# Altium schematic symbol library jlcpcb_2025_04_capacitors_extended_1206.schlib: 2503 symbols (part 6 of 14) (continued)
## CC1206JRNPO0BN100
designator C?  Capacitance: 10pF  (hidden comment: *)
Capacitor, Ceramic (MLCC), 10pF, ±5%, 100V, NP0, ±5%, SMD 1206; Manufacturer: YAGEO; Manufacturer Part Number: CC1206JRNPO0BN100; Package Size: 1206; JLCPCB Basic Part: No; JLCPCB Part Number: C577147; Supplier 1: LCSC; Category: Capacitors - MLCC; Supplier Part Number 1: C577147; Tolerance: ±5%; Voltage Rating: 100V; Temperature Coefficient: NP0; RoHS: Yes; ComponentLink1Description: Datasheet; ComponentLink1URL: https://wmsc.lcsc.com/wmsc/upload/file/pdf/v2/lcsc/2304140030_YAGEO-CC1206JRNPO0BN100_C577147.pdf; ComponentLink2Description: JLCPCB Part URL; ComponentLink2URL: https://jlcpcb.com/partdetail/C577147; ComponentLink3Description: LCSC Part URL; ComponentLink3URL: https://lcsc.com/product-detail/Multilayer-Ceramic-Capacitors-MLCC---SMD-SMT_YAGEO-YAGEO-CC1206JRNPO0BN100_C577147.html
footprint CAP-1206 (1206 (3216M) Capacitor)
pins: 1, 2

## CC1206JRNPO0BN101
designator C?  Capacitance: 100pF  (hidden comment: *)
Capacitor, Ceramic (MLCC), 100pF, ±5%, 100V, NP0, ±5%, SMD 1206; Manufacturer: YAGEO; Manufacturer Part Number: CC1206JRNPO0BN101; Package Size: 1206; JLCPCB Basic Part: No; JLCPCB Part Number: C309499; Supplier 1: LCSC; Category: Capacitors - MLCC; Supplier Part Number 1: C309499; Tolerance: ±5%; Voltage Rating: 100V; Temperature Coefficient: NP0; RoHS: Yes; ComponentLink1Description: Datasheet; ComponentLink1URL: https://wmsc.lcsc.com/wmsc/upload/file/pdf/v2/lcsc/1810241116_YAGEO-CC1206JRNPO0BN101_C309499.pdf; ComponentLink2Description: JLCPCB Part URL; ComponentLink2URL: https://jlcpcb.com/partdetail/C309499; ComponentLink3Description: LCSC Part URL; ComponentLink3URL: https://lcsc.com/product-detail/Multilayer-Ceramic-Capacitors-MLCC---SMD-SMT_YAGEO-YAGEO-CC1206JRNPO0BN101_C309499.html
footprint CAP-1206 (1206 (3216M) Capacitor)
pins: 1, 2

## CC1206JRNPO0BN102
designator C?  Capacitance: 1nF  (hidden comment: *)
Capacitor, Ceramic (MLCC), 1nF, ±5%, 100V, NP0, ±5%, SMD 1206; Manufacturer: YAGEO; Manufacturer Part Number: CC1206JRNPO0BN102; Package Size: 1206; JLCPCB Basic Part: No; JLCPCB Part Number: C513661; Supplier 1: LCSC; Category: Capacitors - MLCC; Supplier Part Number 1: C513661; Tolerance: ±5%; Voltage Rating: 100V; Temperature Coefficient: NP0; RoHS: Yes; ComponentLink1Description: Datasheet; ComponentLink1URL: https://wmsc.lcsc.com/wmsc/upload/file/pdf/v2/lcsc/2005142208_YAGEO-CC1206JRNPO0BN102_C513661.pdf; ComponentLink2Description: JLCPCB Part URL; ComponentLink2URL: https://jlcpcb.com/partdetail/C513661; ComponentLink3Description: LCSC Part URL; ComponentLink3URL: https://lcsc.com/product-detail/Multilayer-Ceramic-Capacitors-MLCC---SMD-SMT_YAGEO-YAGEO-CC1206JRNPO0BN102_C513661.html
footprint CAP-1206 (1206 (3216M) Capacitor)
pins: 1, 2

## CC1206JRNPO0BN121
designator C?  Capacitance: 120pF  (hidden comment: *)
Capacitor, Ceramic (MLCC), 120pF, ±5%, 100V, NP0, ±5%, SMD 1206; Manufacturer: YAGEO; Manufacturer Part Number: CC1206JRNPO0BN121; Package Size: 1206; JLCPCB Basic Part: No; JLCPCB Part Number: C527277; Supplier 1: LCSC; Category: Capacitors - MLCC; Supplier Part Number 1: C527277; Tolerance: ±5%; Voltage Rating: 100V; Temperature Coefficient: NP0; RoHS: Yes; ComponentLink1Description: Datasheet; ComponentLink1URL: https://wmsc.lcsc.com/wmsc/upload/file/pdf/v2/lcsc/2005261833_YAGEO-CC1206JRNPO0BN121_C527277.pdf; ComponentLink2Description: JLCPCB Part URL; ComponentLink2URL: https://jlcpcb.com/partdetail/C527277; ComponentLink3Description: LCSC Part URL; ComponentLink3URL: https://lcsc.com/product-detail/Multilayer-Ceramic-Capacitors-MLCC---SMD-SMT_YAGEO-YAGEO-CC1206JRNPO0BN121_C527277.html
footprint CAP-1206 (1206 (3216M) Capacitor)
pins: 1, 2

## CC1206JRNPO0BN122
designator C?  Capacitance: 1.2nF  (hidden comment: *)
Capacitor, Ceramic (MLCC), 1.2nF, ±5%, 100V, NP0, ±5%, SMD 1206; Manufacturer: YAGEO; Manufacturer Part Number: CC1206JRNPO0BN122; Package Size: 1206; JLCPCB Basic Part: No; JLCPCB Part Number: C527278; Supplier 1: LCSC; Category: Capacitors - MLCC; Supplier Part Number 1: C527278; Tolerance: ±5%; Voltage Rating: 100V; Temperature Coefficient: NP0; RoHS: Yes; ComponentLink1Description: Datasheet; ComponentLink1URL: https://wmsc.lcsc.com/wmsc/upload/file/pdf/v2/lcsc/2006181535_YAGEO-CC1206JRNPO0BN122_C527278.pdf; ComponentLink2Description: JLCPCB Part URL; ComponentLink2URL: https://jlcpcb.com/partdetail/C527278; ComponentLink3Description: LCSC Part URL; ComponentLink3URL: https://lcsc.com/product-detail/Multilayer-Ceramic-Capacitors-MLCC---SMD-SMT_YAGEO-YAGEO-CC1206JRNPO0BN122_C527278.html
footprint CAP-1206 (1206 (3216M) Capacitor)
pins: 1, 2

## CC1206JRNPO0BN151
designator C?  Capacitance: 150pF  (hidden comment: *)
Capacitor, Ceramic (MLCC), 150pF, ±5%, 100V, NP0, ±5%, SMD 1206; Manufacturer: YAGEO; Manufacturer Part Number: CC1206JRNPO0BN151; Package Size: 1206; JLCPCB Basic Part: No; JLCPCB Part Number: C577150; Supplier 1: LCSC; Category: Capacitors - MLCC; Supplier Part Number 1: C577150; Tolerance: ±5%; Voltage Rating: 100V; Temperature Coefficient: NP0; RoHS: Yes; ComponentLink1Description: Datasheet; ComponentLink1URL: https://wmsc.lcsc.com/wmsc/upload/file/pdf/v2/lcsc/2204021130_YAGEO-CC1206JRNPO0BN151_C577150.pdf; ComponentLink2Description: JLCPCB Part URL; ComponentLink2URL: https://jlcpcb.com/partdetail/C577150; ComponentLink3Description: LCSC Part URL; ComponentLink3URL: https://lcsc.com/product-detail/Multilayer-Ceramic-Capacitors-MLCC---SMD-SMT_YAGEO-YAGEO-CC1206JRNPO0BN151_C577150.html
footprint CAP-1206 (1206 (3216M) Capacitor)
pins: 1, 2

## CC1206JRNPO0BN152
designator C?  Capacitance: 1.5nF  (hidden comment: *)
Capacitor, Ceramic (MLCC), 1.5nF, ±5%, 100V, NP0, ±5%, SMD 1206; Manufacturer: YAGEO; Manufacturer Part Number: CC1206JRNPO0BN152; Package Size: 1206; JLCPCB Basic Part: No; JLCPCB Part Number: C309500; Supplier 1: LCSC; Category: Capacitors - MLCC; Supplier Part Number 1: C309500; Tolerance: ±5%; Voltage Rating: 100V; Temperature Coefficient: NP0; RoHS: Yes; ComponentLink1Description: Datasheet; ComponentLink1URL: https://wmsc.lcsc.com/wmsc/upload/file/pdf/v2/lcsc/2304140030_YAGEO-CC1206JRNPO0BN152_C309500.pdf; ComponentLink2Description: JLCPCB Part URL; ComponentLink2URL: https://jlcpcb.com/partdetail/C309500; ComponentLink3Description: LCSC Part URL; ComponentLink3URL: https://lcsc.com/product-detail/Multilayer-Ceramic-Capacitors-MLCC---SMD-SMT_YAGEO-YAGEO-CC1206JRNPO0BN152_C309500.html
footprint CAP-1206 (1206 (3216M) Capacitor)
pins: 1, 2

## CC1206JRNPO0BN180
designator C?  Capacitance: 18pF  (hidden comment: *)
Capacitor, Ceramic (MLCC), 18pF, ±5%, 100V, NP0, ±5%, SMD 1206; Manufacturer: YAGEO; Manufacturer Part Number: CC1206JRNPO0BN180; Package Size: 1206; JLCPCB Basic Part: No; JLCPCB Part Number: C527279; Supplier 1: LCSC; Category: Capacitors - MLCC; Supplier Part Number 1: C527279; Tolerance: ±5%; Voltage Rating: 100V; Temperature Coefficient: NP0; RoHS: Yes; ComponentLink1Description: Datasheet; ComponentLink1URL: https://wmsc.lcsc.com/wmsc/upload/file/pdf/v2/lcsc/2006031836_YAGEO-CC1206JRNPO0BN180_C527279.pdf; ComponentLink2Description: JLCPCB Part URL; ComponentLink2URL: https://jlcpcb.com/partdetail/C527279; ComponentLink3Description: LCSC Part URL; ComponentLink3URL: https://lcsc.com/product-detail/Multilayer-Ceramic-Capacitors-MLCC---SMD-SMT_YAGEO-YAGEO-CC1206JRNPO0BN180_C527279.html
footprint CAP-1206 (1206 (3216M) Capacitor)
pins: 1, 2

## CC1206JRNPO0BN181
designator C?  Capacitance: 180pF  (hidden comment: *)
Capacitor, Ceramic (MLCC), 180pF, ±5%, 100V, NP0, ±5%, SMD 1206; Manufacturer: YAGEO; Manufacturer Part Number: CC1206JRNPO0BN181; Package Size: 1206; JLCPCB Basic Part: No; JLCPCB Part Number: C527280; Supplier 1: LCSC; Category: Capacitors - MLCC; Supplier Part Number 1: C527280; Tolerance: ±5%; Voltage Rating: 100V; Temperature Coefficient: NP0; RoHS: Yes; ComponentLink1Description: Datasheet; ComponentLink1URL: https://wmsc.lcsc.com/wmsc/upload/file/pdf/v2/lcsc/2007021837_YAGEO-CC1206JRNPO0BN181_C527280.pdf; ComponentLink2Description: JLCPCB Part URL; ComponentLink2URL: https://jlcpcb.com/partdetail/C527280; ComponentLink3Description: LCSC Part URL; ComponentLink3URL: https://lcsc.com/product-detail/Multilayer-Ceramic-Capacitors-MLCC---SMD-SMT_YAGEO-YAGEO-CC1206JRNPO0BN181_C527280.html
footprint CAP-1206 (1206 (3216M) Capacitor)
pins: 1, 2

## CC1206JRNPO0BN182
designator C?  Capacitance: 1.8nF  (hidden comment: *)
Capacitor, Ceramic (MLCC), 1.8nF, ±5%, 100V, NP0, ±5%, SMD 1206; Manufacturer: YAGEO; Manufacturer Part Number: CC1206JRNPO0BN182; Package Size: 1206; JLCPCB Basic Part: No; JLCPCB Part Number: C527281; Supplier 1: LCSC; Category: Capacitors - MLCC; Supplier Part Number 1: C527281; Tolerance: ±5%; Voltage Rating: 100V; Temperature Coefficient: NP0; RoHS: Yes; ComponentLink1Description: Datasheet; ComponentLink1URL: https://wmsc.lcsc.com/wmsc/upload/file/pdf/v2/lcsc/2005222142_YAGEO-CC1206JRNPO0BN182_C527281.pdf; ComponentLink2Description: JLCPCB Part URL; ComponentLink2URL: https://jlcpcb.com/partdetail/C527281; ComponentLink3Description: LCSC Part URL; ComponentLink3URL: https://lcsc.com/product-detail/Multilayer-Ceramic-Capacitors-MLCC---SMD-SMT_YAGEO-YAGEO-CC1206JRNPO0BN182_C527281.html
footprint CAP-1206 (1206 (3216M) Capacitor)
pins: 1, 2

## CC1206JRNPO0BN220
designator C?  Capacitance: 22pF  (hidden comment: *)
Capacitor, Ceramic (MLCC), 22pF, ±5%, 100V, NP0, ±5%, SMD 1206; Manufacturer: YAGEO; Manufacturer Part Number: CC1206JRNPO0BN220; Package Size: 1206; JLCPCB Basic Part: No; JLCPCB Part Number: C113878; Supplier 1: LCSC; Category: Capacitors - MLCC; Supplier Part Number 1: C113878; Tolerance: ±5%; Voltage Rating: 100V; Temperature Coefficient: NP0; RoHS: Yes; ComponentLink1Description: Datasheet; ComponentLink1URL: https://wmsc.lcsc.com/wmsc/upload/file/pdf/v2/lcsc/2304140030_YAGEO-CC1206JRNPO0BN220_C113878.pdf; ComponentLink2Description: JLCPCB Part URL; ComponentLink2URL: https://jlcpcb.com/partdetail/C113878; ComponentLink3Description: LCSC Part URL; ComponentLink3URL: https://lcsc.com/product-detail/Multilayer-Ceramic-Capacitors-MLCC---SMD-SMT_YAGEO-YAGEO-CC1206JRNPO0BN220_C113878.html
footprint CAP-1206 (1206 (3216M) Capacitor)
pins: 1, 2

## CC1206JRNPO0BN221
designator C?  Capacitance: 220pF  (hidden comment: *)
Capacitor, Ceramic (MLCC), 220pF, ±5%, 100V, NP0, ±5%, SMD 1206; Manufacturer: YAGEO; Manufacturer Part Number: CC1206JRNPO0BN221; Package Size: 1206; JLCPCB Basic Part: No; JLCPCB Part Number: C113879; Supplier 1: LCSC; Category: Capacitors - MLCC; Supplier Part Number 1: C113879; Tolerance: ±5%; Voltage Rating: 100V; Temperature Coefficient: NP0; RoHS: Yes; ComponentLink1Description: Datasheet; ComponentLink1URL: https://wmsc.lcsc.com/wmsc/upload/file/pdf/v2/lcsc/2304140030_YAGEO-CC1206JRNPO0BN221_C113879.pdf; ComponentLink2Description: JLCPCB Part URL; ComponentLink2URL: https://jlcpcb.com/partdetail/C113879; ComponentLink3Description: LCSC Part URL; ComponentLink3URL: https://lcsc.com/product-detail/Multilayer-Ceramic-Capacitors-MLCC---SMD-SMT_YAGEO-YAGEO-CC1206JRNPO0BN221_C113879.html
footprint CAP-1206 (1206 (3216M) Capacitor)
pins: 1, 2

## CC1206JRNPO0BN222
designator C?  Capacitance: 2.2nF  (hidden comment: *)
Capacitor, Ceramic (MLCC), 2.2nF, ±5%, 100V, NP0, ±5%, SMD 1206; Manufacturer: YAGEO; Manufacturer Part Number: CC1206JRNPO0BN222; Package Size: 1206; JLCPCB Basic Part: No; JLCPCB Part Number: C577152; Supplier 1: LCSC; Category: Capacitors - MLCC; Supplier Part Number 1: C577152; Tolerance: ±5%; Voltage Rating: 100V; Temperature Coefficient: NP0; RoHS: Yes; ComponentLink1Description: Datasheet; ComponentLink1URL: https://wmsc.lcsc.com/wmsc/upload/file/pdf/v2/lcsc/2009261808_YAGEO-CC1206JRNPO0BN222_C577152.pdf; ComponentLink2Description: JLCPCB Part URL; ComponentLink2URL: https://jlcpcb.com/partdetail/C577152; ComponentLink3Description: LCSC Part URL; ComponentLink3URL: https://lcsc.com/product-detail/Multilayer-Ceramic-Capacitors-MLCC---SMD-SMT_YAGEO-YAGEO-CC1206JRNPO0BN222_C577152.html
footprint CAP-1206 (1206 (3216M) Capacitor)
pins: 1, 2

## CC1206JRNPO0BN272
designator C?  Capacitance: 2.7nF  (hidden comment: *)
Capacitor, Ceramic (MLCC), 2.7nF, ±5%, 100V, NP0, ±5%, SMD 1206; Manufacturer: YAGEO; Manufacturer Part Number: CC1206JRNPO0BN272; Package Size: 1206; JLCPCB Basic Part: No; JLCPCB Part Number: C527283; Supplier 1: LCSC; Category: Capacitors - MLCC; Supplier Part Number 1: C527283; Tolerance: ±5%; Voltage Rating: 100V; Temperature Coefficient: NP0; RoHS: Yes; ComponentLink1Description: Datasheet; ComponentLink1URL: https://wmsc.lcsc.com/wmsc/upload/file/pdf/v2/lcsc/2005222142_YAGEO-CC1206JRNPO0BN272_C527283.pdf; ComponentLink2Description: JLCPCB Part URL; ComponentLink2URL: https://jlcpcb.com/partdetail/C527283; ComponentLink3Description: LCSC Part URL; ComponentLink3URL: https://lcsc.com/product-detail/Multilayer-Ceramic-Capacitors-MLCC---SMD-SMT_YAGEO-YAGEO-CC1206JRNPO0BN272_C527283.html
footprint CAP-1206 (1206 (3216M) Capacitor)
pins: 1, 2

## CC1206JRNPO0BN330
designator C?  Capacitance: 33pF  (hidden comment: *)
Capacitor, Ceramic (MLCC), 33pF, ±5%, 100V, NP0, ±5%, SMD 1206; Manufacturer: YAGEO; Manufacturer Part Number: CC1206JRNPO0BN330; Package Size: 1206; JLCPCB Basic Part: No; JLCPCB Part Number: C527284; Supplier 1: LCSC; Category: Capacitors - MLCC; Supplier Part Number 1: C527284; Tolerance: ±5%; Voltage Rating: 100V; Temperature Coefficient: NP0; RoHS: Yes; ComponentLink1Description: Datasheet; ComponentLink1URL: https://wmsc.lcsc.com/wmsc/upload/file/pdf/v2/lcsc/2005222142_YAGEO-CC1206JRNPO0BN330_C527284.pdf; ComponentLink2Description: JLCPCB Part URL; ComponentLink2URL: https://jlcpcb.com/partdetail/C527284; ComponentLink3Description: LCSC Part URL; ComponentLink3URL: https://lcsc.com/product-detail/Multilayer-Ceramic-Capacitors-MLCC---SMD-SMT_YAGEO-YAGEO-CC1206JRNPO0BN330_C527284.html
footprint CAP-1206 (1206 (3216M) Capacitor)
pins: 1, 2

## CC1206JRNPO0BN331
designator C?  Capacitance: 330pF  (hidden comment: *)
Capacitor, Ceramic (MLCC), 330pF, ±5%, 100V, NP0, ±5%, SMD 1206; Manufacturer: YAGEO; Manufacturer Part Number: CC1206JRNPO0BN331; Package Size: 1206; JLCPCB Basic Part: No; JLCPCB Part Number: C527285; Supplier 1: LCSC; Category: Capacitors - MLCC; Supplier Part Number 1: C527285; Tolerance: ±5%; Voltage Rating: 100V; Temperature Coefficient: NP0; RoHS: Yes; ComponentLink1Description: Datasheet; ComponentLink1URL: https://wmsc.lcsc.com/wmsc/upload/file/pdf/v2/lcsc/2006031836_YAGEO-CC1206JRNPO0BN331_C527285.pdf; ComponentLink2Description: JLCPCB Part URL; ComponentLink2URL: https://jlcpcb.com/partdetail/C527285; ComponentLink3Description: LCSC Part URL; ComponentLink3URL: https://lcsc.com/product-detail/Multilayer-Ceramic-Capacitors-MLCC---SMD-SMT_YAGEO-YAGEO-CC1206JRNPO0BN331_C527285.html
footprint CAP-1206 (1206 (3216M) Capacitor)
pins: 1, 2

## CC1206JRNPO0BN332
designator C?  Capacitance: 3.3nF  (hidden comment: *)
Capacitor, Ceramic (MLCC), 3.3nF, ±5%, 100V, NP0, ±5%, SMD 1206; Manufacturer: YAGEO; Manufacturer Part Number: CC1206JRNPO0BN332; Package Size: 1206; JLCPCB Basic Part: No; JLCPCB Part Number: C527286; Supplier 1: LCSC; Category: Capacitors - MLCC; Supplier Part Number 1: C527286; Tolerance: ±5%; Voltage Rating: 100V; Temperature Coefficient: NP0; RoHS: Yes; ComponentLink1Description: Datasheet; ComponentLink1URL: https://wmsc.lcsc.com/wmsc/upload/file/pdf/v2/lcsc/2005222142_YAGEO-CC1206JRNPO0BN332_C527286.pdf; ComponentLink2Description: JLCPCB Part URL; ComponentLink2URL: https://jlcpcb.com/partdetail/C527286; ComponentLink3Description: LCSC Part URL; ComponentLink3URL: https://lcsc.com/product-detail/Multilayer-Ceramic-Capacitors-MLCC---SMD-SMT_YAGEO-YAGEO-CC1206JRNPO0BN332_C527286.html
footprint CAP-1206 (1206 (3216M) Capacitor)
pins: 1, 2

## CC1206JRNPO0BN390
designator C?  Capacitance: 39pF  (hidden comment: *)
Capacitor, Ceramic (MLCC), 39pF, ±5%, 100V, NP0, ±5%, SMD 1206; Manufacturer: YAGEO; Manufacturer Part Number: CC1206JRNPO0BN390; Package Size: 1206; JLCPCB Basic Part: No; JLCPCB Part Number: C527287; Supplier 1: LCSC; Category: Capacitors - MLCC; Supplier Part Number 1: C527287; Tolerance: ±5%; Voltage Rating: 100V; Temperature Coefficient: NP0; RoHS: Yes; ComponentLink1Description: Datasheet; ComponentLink1URL: https://wmsc.lcsc.com/wmsc/upload/file/pdf/v2/lcsc/2006031836_YAGEO-CC1206JRNPO0BN390_C527287.pdf; ComponentLink2Description: JLCPCB Part URL; ComponentLink2URL: https://jlcpcb.com/partdetail/C527287; ComponentLink3Description: LCSC Part URL; ComponentLink3URL: https://lcsc.com/product-detail/Multilayer-Ceramic-Capacitors-MLCC---SMD-SMT_YAGEO-YAGEO-CC1206JRNPO0BN390_C527287.html
footprint CAP-1206 (1206 (3216M) Capacitor)
pins: 1, 2

## CC1206JRNPO0BN391
designator C?  Capacitance: 390pF  (hidden comment: *)
Capacitor, Ceramic (MLCC), 390pF, ±5%, 100V, NP0, ±5%, SMD 1206; Manufacturer: YAGEO; Manufacturer Part Number: CC1206JRNPO0BN391; Package Size: 1206; JLCPCB Basic Part: No; JLCPCB Part Number: C527288; Supplier 1: LCSC; Category: Capacitors - MLCC; Supplier Part Number 1: C527288; Tolerance: ±5%; Voltage Rating: 100V; Temperature Coefficient: NP0; RoHS: Yes; ComponentLink1Description: Datasheet; ComponentLink1URL: https://wmsc.lcsc.com/wmsc/upload/file/pdf/v2/lcsc/2006031836_YAGEO-CC1206JRNPO0BN391_C527288.pdf; ComponentLink2Description: JLCPCB Part URL; ComponentLink2URL: https://jlcpcb.com/partdetail/C527288; ComponentLink3Description: LCSC Part URL; ComponentLink3URL: https://lcsc.com/product-detail/Multilayer-Ceramic-Capacitors-MLCC---SMD-SMT_YAGEO-YAGEO-CC1206JRNPO0BN391_C527288.html
footprint CAP-1206 (1206 (3216M) Capacitor)
pins: 1, 2

## CC1206JRNPO0BN470
designator C?  Capacitance: 47pF  (hidden comment: *)
Capacitor, Ceramic (MLCC), 47pF, ±5%, 100V, NP0, ±5%, SMD 1206; Manufacturer: YAGEO; Manufacturer Part Number: CC1206JRNPO0BN470; Package Size: 1206; JLCPCB Basic Part: No; JLCPCB Part Number: C577155; Supplier 1: LCSC; Category: Capacitors - MLCC; Supplier Part Number 1: C577155; Tolerance: ±5%; Voltage Rating: 100V; Temperature Coefficient: NP0; RoHS: Yes; ComponentLink1Description: Datasheet; ComponentLink1URL: https://wmsc.lcsc.com/wmsc/upload/file/pdf/v2/lcsc/2204021130_YAGEO-CC1206JRNPO0BN470_C577155.pdf; ComponentLink2Description: JLCPCB Part URL; ComponentLink2URL: https://jlcpcb.com/partdetail/C577155; ComponentLink3Description: LCSC Part URL; ComponentLink3URL: https://lcsc.com/product-detail/Multilayer-Ceramic-Capacitors-MLCC---SMD-SMT_YAGEO-YAGEO-CC1206JRNPO0BN470_C577155.html
footprint CAP-1206 (1206 (3216M) Capacitor)
pins: 1, 2

## CC1206JRNPO0BN471
designator C?  Capacitance: 470pF  (hidden comment: *)
Capacitor, Ceramic (MLCC), 470pF, ±5%, 100V, NP0, ±5%, SMD 1206; Manufacturer: YAGEO; Manufacturer Part Number: CC1206JRNPO0BN471; Package Size: 1206; JLCPCB Basic Part: No; JLCPCB Part Number: C113880; Supplier 1: LCSC; Category: Capacitors - MLCC; Supplier Part Number 1: C113880; Tolerance: ±5%; Voltage Rating: 100V; Temperature Coefficient: NP0; RoHS: Yes; ComponentLink1Description: Datasheet; ComponentLink1URL: https://wmsc.lcsc.com/wmsc/upload/file/pdf/v2/lcsc/2304140030_YAGEO-CC1206JRNPO0BN471_C113880.pdf; ComponentLink2Description: JLCPCB Part URL; ComponentLink2URL: https://jlcpcb.com/partdetail/C113880; ComponentLink3Description: LCSC Part URL; ComponentLink3URL: https://lcsc.com/product-detail/Multilayer-Ceramic-Capacitors-MLCC---SMD-SMT_YAGEO-YAGEO-CC1206JRNPO0BN471_C113880.html
footprint CAP-1206 (1206 (3216M) Capacitor)
pins: 1, 2

## CC1206JRNPO0BN472
designator C?  Capacitance: 4.7nF  (hidden comment: *)
Capacitor, Ceramic (MLCC), 4.7nF, ±5%, 100V, NP0, ±5%, SMD 1206; Manufacturer: YAGEO; Manufacturer Part Number: CC1206JRNPO0BN472; Package Size: 1206; JLCPCB Basic Part: No; JLCPCB Part Number: C577156; Supplier 1: LCSC; Category: Capacitors - MLCC; Supplier Part Number 1: C577156; Tolerance: ±5%; Voltage Rating: 100V; Temperature Coefficient: NP0; RoHS: Yes; ComponentLink1Description: Datasheet; ComponentLink1URL: https://wmsc.lcsc.com/wmsc/upload/file/pdf/v2/lcsc/2203221230_YAGEO-CC1206JRNPO0BN472_C577156.pdf; ComponentLink2Description: JLCPCB Part URL; ComponentLink2URL: https://jlcpcb.com/partdetail/C577156; ComponentLink3Description: LCSC Part URL; ComponentLink3URL: https://lcsc.com/product-detail/Multilayer-Ceramic-Capacitors-MLCC---SMD-SMT_YAGEO-YAGEO-CC1206JRNPO0BN472_C577156.html
footprint CAP-1206 (1206 (3216M) Capacitor)
pins: 1, 2

## CC1206JRNPO0BN560
designator C?  Capacitance: 56pF  (hidden comment: *)
Capacitor, Ceramic (MLCC), 56pF, ±5%, 100V, NP0, ±5%, SMD 1206; Manufacturer: YAGEO; Manufacturer Part Number: CC1206JRNPO0BN560; Package Size: 1206; JLCPCB Basic Part: No; JLCPCB Part Number: C527289; Supplier 1: LCSC; Category: Capacitors - MLCC; Supplier Part Number 1: C527289; Tolerance: ±5%; Voltage Rating: 100V; Temperature Coefficient: NP0; RoHS: Yes; ComponentLink1Description: Datasheet; ComponentLink1URL: https://wmsc.lcsc.com/wmsc/upload/file/pdf/v2/lcsc/2006031836_YAGEO-CC1206JRNPO0BN560_C527289.pdf; ComponentLink2Description: JLCPCB Part URL; ComponentLink2URL: https://jlcpcb.com/partdetail/C527289; ComponentLink3Description: LCSC Part URL; ComponentLink3URL: https://lcsc.com/product-detail/Multilayer-Ceramic-Capacitors-MLCC---SMD-SMT_YAGEO-YAGEO-CC1206JRNPO0BN560_C527289.html
footprint CAP-1206 (1206 (3216M) Capacitor)
pins: 1, 2

## CC1206JRNPO0BN561
designator C?  Capacitance: 560pF  (hidden comment: *)
Capacitor, Ceramic (MLCC), 560pF, ±5%, 100V, NP0, ±5%, SMD 1206; Manufacturer: YAGEO; Manufacturer Part Number: CC1206JRNPO0BN561; Package Size: 1206; JLCPCB Basic Part: No; JLCPCB Part Number: C527290; Supplier 1: LCSC; Category: Capacitors - MLCC; Supplier Part Number 1: C527290; Tolerance: ±5%; Voltage Rating: 100V; Temperature Coefficient: NP0; RoHS: Yes; ComponentLink1Description: Datasheet; ComponentLink1URL: https://wmsc.lcsc.com/wmsc/upload/file/pdf/v2/lcsc/2007221234_YAGEO-CC1206JRNPO0BN561_C527290.pdf; ComponentLink2Description: JLCPCB Part URL; ComponentLink2URL: https://jlcpcb.com/partdetail/C527290; ComponentLink3Description: LCSC Part URL; ComponentLink3URL: https://lcsc.com/product-detail/Multilayer-Ceramic-Capacitors-MLCC---SMD-SMT_YAGEO-YAGEO-CC1206JRNPO0BN561_C527290.html
footprint CAP-1206 (1206 (3216M) Capacitor)
pins: 1, 2

## CC1206JRNPO0BN680
designator C?  Capacitance: 68pF  (hidden comment: *)
Capacitor, Ceramic (MLCC), 68pF, ±5%, 100V, NP0, ±5%, SMD 1206; Manufacturer: YAGEO; Manufacturer Part Number: CC1206JRNPO0BN680; Package Size: 1206; JLCPCB Basic Part: No; JLCPCB Part Number: C577157; Supplier 1: LCSC; Category: Capacitors - MLCC; Supplier Part Number 1: C577157; Tolerance: ±5%; Voltage Rating: 100V; Temperature Coefficient: NP0; RoHS: Yes; ComponentLink1Description: Datasheet; ComponentLink1URL: https://wmsc.lcsc.com/wmsc/upload/file/pdf/v2/lcsc/2211281000_YAGEO-CC1206JRNPO0BN680_C577157.pdf; ComponentLink2Description: JLCPCB Part URL; ComponentLink2URL: https://jlcpcb.com/partdetail/C577157; ComponentLink3Description: LCSC Part URL; ComponentLink3URL: https://lcsc.com/product-detail/Multilayer-Ceramic-Capacitors-MLCC---SMD-SMT_YAGEO-YAGEO-CC1206JRNPO0BN680_C577157.html
footprint CAP-1206 (1206 (3216M) Capacitor)
pins: 1, 2

## CC1206JRNPO0BN681
designator C?  Capacitance: 680pF  (hidden comment: *)
Capacitor, Ceramic (MLCC), 680pF, ±5%, 100V, NP0, ±5%, SMD 1206; Manufacturer: YAGEO; Manufacturer Part Number: CC1206JRNPO0BN681; Package Size: 1206; JLCPCB Basic Part: No; JLCPCB Part Number: C326939; Supplier 1: LCSC; Category: Capacitors - MLCC; Supplier Part Number 1: C326939; Tolerance: ±5%; Voltage Rating: 100V; Temperature Coefficient: NP0; RoHS: Yes; ComponentLink1Description: Datasheet; ComponentLink1URL: https://wmsc.lcsc.com/wmsc/upload/file/pdf/v2/lcsc/1811151646_YAGEO-CC1206JRNPO0BN681_C326939.pdf; ComponentLink2Description: JLCPCB Part URL; ComponentLink2URL: https://jlcpcb.com/partdetail/C326939; ComponentLink3Description: LCSC Part URL; ComponentLink3URL: https://lcsc.com/product-detail/Multilayer-Ceramic-Capacitors-MLCC---SMD-SMT_YAGEO-YAGEO-CC1206JRNPO0BN681_C326939.html
footprint CAP-1206 (1206 (3216M) Capacitor)
pins: 1, 2

## CC1206JRNPO0BN820
designator C?  Capacitance: 82pF  (hidden comment: *)
Capacitor, Ceramic (MLCC), 82pF, ±5%, 100V, NP0, ±5%, SMD 1206; Manufacturer: YAGEO; Manufacturer Part Number: CC1206JRNPO0BN820; Package Size: 1206; JLCPCB Basic Part: No; JLCPCB Part Number: C527291; Supplier 1: LCSC; Category: Capacitors - MLCC; Supplier Part Number 1: C527291; Tolerance: ±5%; Voltage Rating: 100V; Temperature Coefficient: NP0; RoHS: Yes; ComponentLink1Description: Datasheet; ComponentLink1URL: https://wmsc.lcsc.com/wmsc/upload/file/pdf/v2/lcsc/2006241834_YAGEO-CC1206JRNPO0BN820_C527291.pdf; ComponentLink2Description: JLCPCB Part URL; ComponentLink2URL: https://jlcpcb.com/partdetail/C527291; ComponentLink3Description: LCSC Part URL; ComponentLink3URL: https://lcsc.com/product-detail/Multilayer-Ceramic-Capacitors-MLCC---SMD-SMT_YAGEO-YAGEO-CC1206JRNPO0BN820_C527291.html
footprint CAP-1206 (1206 (3216M) Capacitor)
pins: 1, 2

## CC1206JRNPO0BN821
designator C?  Capacitance: 820pF  (hidden comment: *)
Capacitor, Ceramic (MLCC), 820pF, ±5%, 100V, NP0, ±5%, SMD 1206; Manufacturer: YAGEO; Manufacturer Part Number: CC1206JRNPO0BN821; Package Size: 1206; JLCPCB Basic Part: No; JLCPCB Part Number: C527292; Supplier 1: LCSC; Category: Capacitors - MLCC; Supplier Part Number 1: C527292; Tolerance: ±5%; Voltage Rating: 100V; Temperature Coefficient: NP0; RoHS: Yes; ComponentLink1Description: Datasheet; ComponentLink1URL: https://wmsc.lcsc.com/wmsc/upload/file/pdf/v2/lcsc/2007021837_YAGEO-CC1206JRNPO0BN821_C527292.pdf; ComponentLink2Description: JLCPCB Part URL; ComponentLink2URL: https://jlcpcb.com/partdetail/C527292; ComponentLink3Description: LCSC Part URL; ComponentLink3URL: https://lcsc.com/product-detail/Multilayer-Ceramic-Capacitors-MLCC---SMD-SMT_YAGEO-YAGEO-CC1206JRNPO0BN821_C527292.html
footprint CAP-1206 (1206 (3216M) Capacitor)
pins: 1, 2

## CC1206JRNPO9BN100
designator C?  Capacitance: 10pF  (hidden comment: *)
Capacitor, Ceramic (MLCC), 10pF, ±5%, 50V, NP0, ±5%, SMD 1206; Manufacturer: YAGEO; Manufacturer Part Number: CC1206JRNPO9BN100; Package Size: 1206; JLCPCB Basic Part: No; JLCPCB Part Number: C326850; Supplier 1: LCSC; Category: Capacitors - MLCC; Supplier Part Number 1: C326850; Tolerance: ±5%; Voltage Rating: 50V; Temperature Coefficient: NP0; RoHS: Yes; ComponentLink1Description: Datasheet; ComponentLink1URL: https://wmsc.lcsc.com/wmsc/upload/file/pdf/v2/lcsc/1811151647_YAGEO-CC1206JRNPO9BN100_C326850.pdf; ComponentLink2Description: JLCPCB Part URL; ComponentLink2URL: https://jlcpcb.com/partdetail/C326850; ComponentLink3Description: LCSC Part URL; ComponentLink3URL: https://lcsc.com/product-detail/Multilayer-Ceramic-Capacitors-MLCC---SMD-SMT_YAGEO-YAGEO-CC1206JRNPO9BN100_C326850.html
footprint CAP-1206 (1206 (3216M) Capacitor)
pins: 1, 2

## CC1206JRNPO9BN101
designator C?  Capacitance: 100pF  (hidden comment: *)
Capacitor, Ceramic (MLCC), 100pF, ±5%, 50V, NP0, ±5%, SMD 1206; Manufacturer: YAGEO; Manufacturer Part Number: CC1206JRNPO9BN101; Package Size: 1206; JLCPCB Basic Part: No; JLCPCB Part Number: C107179; Supplier 1: LCSC; Category: Capacitors - MLCC; Supplier Part Number 1: C107179; Tolerance: ±5%; Voltage Rating: 50V; Temperature Coefficient: NP0; RoHS: Yes; ComponentLink1Description: Datasheet; ComponentLink1URL: https://wmsc.lcsc.com/wmsc/upload/file/pdf/v2/lcsc/2304140030_YAGEO-CC1206JRNPO9BN101_C107179.pdf; ComponentLink2Description: JLCPCB Part URL; ComponentLink2URL: https://jlcpcb.com/partdetail/C107179; ComponentLink3Description: LCSC Part URL; ComponentLink3URL: https://lcsc.com/product-detail/Multilayer-Ceramic-Capacitors-MLCC---SMD-SMT_YAGEO-YAGEO-CC1206JRNPO9BN101_C107179.html
footprint CAP-1206 (1206 (3216M) Capacitor)
pins: 1, 2

## CC1206JRNPO9BN102
designator C?  Capacitance: 1nF  (hidden comment: *)
Capacitor, Ceramic (MLCC), 1nF, ±5%, 50V, NP0, ±5%, SMD 1206; Manufacturer: YAGEO; Manufacturer Part Number: CC1206JRNPO9BN102; Package Size: 1206; JLCPCB Basic Part: No; JLCPCB Part Number: C113881; Supplier 1: LCSC; Category: Capacitors - MLCC; Supplier Part Number 1: C113881; Tolerance: ±5%; Voltage Rating: 50V; Temperature Coefficient: NP0; RoHS: Yes; ComponentLink1Description: Datasheet; ComponentLink1URL: https://wmsc.lcsc.com/wmsc/upload/file/pdf/v2/lcsc/2304140030_YAGEO-CC1206JRNPO9BN102_C113881.pdf; ComponentLink2Description: JLCPCB Part URL; ComponentLink2URL: https://jlcpcb.com/partdetail/C113881; ComponentLink3Description: LCSC Part URL; ComponentLink3URL: https://lcsc.com/product-detail/Multilayer-Ceramic-Capacitors-MLCC---SMD-SMT_YAGEO-YAGEO-CC1206JRNPO9BN102_C113881.html
footprint CAP-1206 (1206 (3216M) Capacitor)
pins: 1, 2

## CC1206JRNPO9BN120
designator C?  Capacitance: 12pF  (hidden comment: *)
Capacitor, Ceramic (MLCC), 12pF, ±5%, 50V, NP0, ±5%, SMD 1206; Manufacturer: YAGEO; Manufacturer Part Number: CC1206JRNPO9BN120; Package Size: 1206; JLCPCB Basic Part: No; JLCPCB Part Number: C113882; Supplier 1: LCSC; Category: Capacitors - MLCC; Supplier Part Number 1: C113882; Tolerance: ±5%; Voltage Rating: 50V; Temperature Coefficient: NP0; RoHS: Yes; ComponentLink1Description: Datasheet; ComponentLink1URL: https://wmsc.lcsc.com/wmsc/upload/file/pdf/v2/lcsc/2304140030_YAGEO-CC1206JRNPO9BN120_C113882.pdf; ComponentLink2Description: JLCPCB Part URL; ComponentLink2URL: https://jlcpcb.com/partdetail/C113882; ComponentLink3Description: LCSC Part URL; ComponentLink3URL: https://lcsc.com/product-detail/Multilayer-Ceramic-Capacitors-MLCC---SMD-SMT_YAGEO-YAGEO-CC1206JRNPO9BN120_C113882.html
footprint CAP-1206 (1206 (3216M) Capacitor)
pins: 1, 2

## CC1206JRNPO9BN121
designator C?  Capacitance: 120pF  (hidden comment: *)
Capacitor, Ceramic (MLCC), 120pF, ±5%, 50V, NP0, ±5%, SMD 1206; Manufacturer: YAGEO; Manufacturer Part Number: CC1206JRNPO9BN121; Package Size: 1206; JLCPCB Basic Part: No; JLCPCB Part Number: C326851; Supplier 1: LCSC; Category: Capacitors - MLCC; Supplier Part Number 1: C326851; Tolerance: ±5%; Voltage Rating: 50V; Temperature Coefficient: NP0; RoHS: Yes; ComponentLink1Description: Datasheet; ComponentLink1URL: https://wmsc.lcsc.com/wmsc/upload/file/pdf/v2/lcsc/1811141224_YAGEO-CC1206JRNPO9BN121_C326851.pdf; ComponentLink2Description: JLCPCB Part URL; ComponentLink2URL: https://jlcpcb.com/partdetail/C326851; ComponentLink3Description: LCSC Part URL; ComponentLink3URL: https://lcsc.com/product-detail/Multilayer-Ceramic-Capacitors-MLCC---SMD-SMT_YAGEO-YAGEO-CC1206JRNPO9BN121_C326851.html
footprint CAP-1206 (1206 (3216M) Capacitor)
pins: 1, 2

## CC1206JRNPO9BN122
designator C?  Capacitance: 1.2nF  (hidden comment: *)
Capacitor, Ceramic (MLCC), 1.2nF, ±5%, 50V, NP0, ±5%, SMD 1206; Manufacturer: YAGEO; Manufacturer Part Number: CC1206JRNPO9BN122; Package Size: 1206; JLCPCB Basic Part: No; JLCPCB Part Number: C136441; Supplier 1: LCSC; Category: Capacitors - MLCC; Supplier Part Number 1: C136441; Tolerance: ±5%; Voltage Rating: 50V; Temperature Coefficient: NP0; RoHS: Yes; ComponentLink1Description: Datasheet; ComponentLink1URL: https://wmsc.lcsc.com/wmsc/upload/file/pdf/v2/lcsc/2304140030_YAGEO-CC1206JRNPO9BN122_C136441.pdf; ComponentLink2Description: JLCPCB Part URL; ComponentLink2URL: https://jlcpcb.com/partdetail/C136441; ComponentLink3Description: LCSC Part URL; ComponentLink3URL: https://lcsc.com/product-detail/Multilayer-Ceramic-Capacitors-MLCC---SMD-SMT_YAGEO-YAGEO-CC1206JRNPO9BN122_C136441.html
footprint CAP-1206 (1206 (3216M) Capacitor)
pins: 1, 2

## CC1206JRNPO9BN150
designator C?  Capacitance: 15pF  (hidden comment: *)
Capacitor, Ceramic (MLCC), 15pF, ±5%, 50V, NP0, ±5%, SMD 1206; Manufacturer: YAGEO; Manufacturer Part Number: CC1206JRNPO9BN150; Package Size: 1206; JLCPCB Basic Part: No; JLCPCB Part Number: C541476; Supplier 1: LCSC; Category: Capacitors - MLCC; Supplier Part Number 1: C541476; Tolerance: ±5%; Voltage Rating: 50V; Temperature Coefficient: NP0; RoHS: Yes; ComponentLink1Description: Datasheet; ComponentLink1URL: https://wmsc.lcsc.com/wmsc/upload/file/pdf/v2/lcsc/2006151139_YAGEO-CC1206JRNPO9BN150_C541476.pdf; ComponentLink2Description: JLCPCB Part URL; ComponentLink2URL: https://jlcpcb.com/partdetail/C541476; ComponentLink3Description: LCSC Part URL; ComponentLink3URL: https://lcsc.com/product-detail/Multilayer-Ceramic-Capacitors-MLCC---SMD-SMT_YAGEO-YAGEO-CC1206JRNPO9BN150_C541476.html
footprint CAP-1206 (1206 (3216M) Capacitor)
pins: 1, 2

## CC1206JRNPO9BN151
designator C?  Capacitance: 150pF  (hidden comment: *)
Capacitor, Ceramic (MLCC), 150pF, ±5%, 50V, NP0, ±5%, SMD 1206; Manufacturer: YAGEO; Manufacturer Part Number: CC1206JRNPO9BN151; Package Size: 1206; JLCPCB Basic Part: No; JLCPCB Part Number: C107180; Supplier 1: LCSC; Category: Capacitors - MLCC; Supplier Part Number 1: C107180; Tolerance: ±5%; Voltage Rating: 50V; Temperature Coefficient: NP0; RoHS: Yes; ComponentLink1Description: Datasheet; ComponentLink1URL: https://wmsc.lcsc.com/wmsc/upload/file/pdf/v2/lcsc/2304140030_YAGEO-CC1206JRNPO9BN151_C107180.pdf; ComponentLink2Description: JLCPCB Part URL; ComponentLink2URL: https://jlcpcb.com/partdetail/C107180; ComponentLink3Description: LCSC Part URL; ComponentLink3URL: https://lcsc.com/product-detail/Multilayer-Ceramic-Capacitors-MLCC---SMD-SMT_YAGEO-YAGEO-CC1206JRNPO9BN151_C107180.html
footprint CAP-1206 (1206 (3216M) Capacitor)
pins: 1, 2

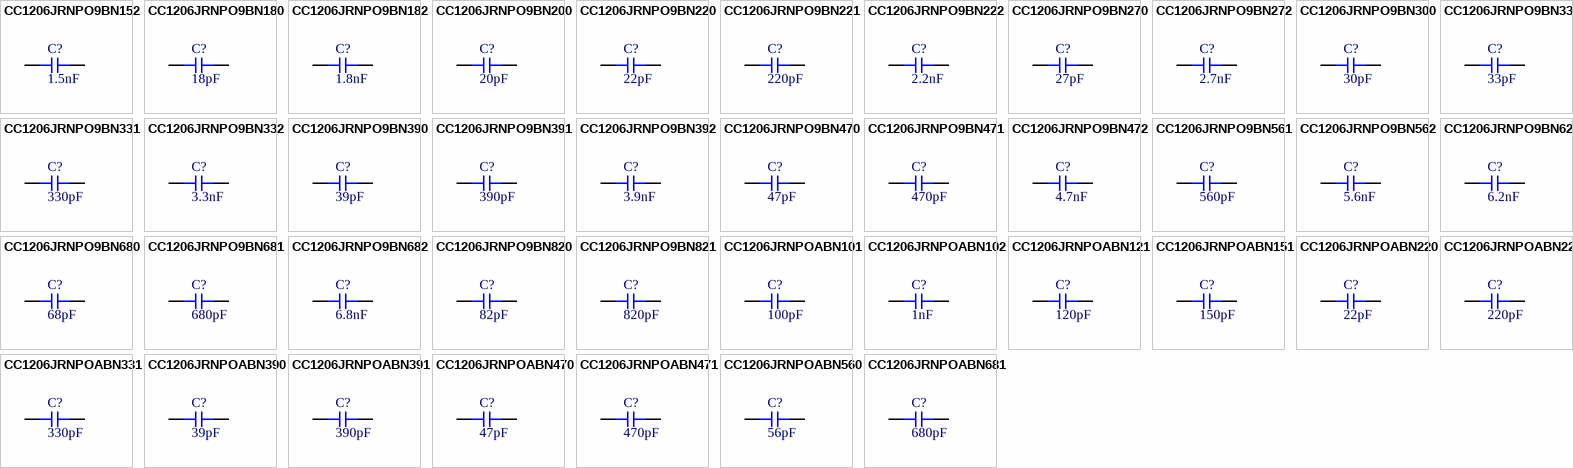
[diagram p27: symbols CC1206JRNPO9BN152 to CC1206JRNPOABN681]

## CC1206JRNPO9BN152
designator C?  Capacitance: 1.5nF  (hidden comment: *)
Capacitor, Ceramic (MLCC), 1.5nF, ±5%, 50V, NP0, ±5%, SMD 1206; Manufacturer: YAGEO; Manufacturer Part Number: CC1206JRNPO9BN152; Package Size: 1206; JLCPCB Basic Part: No; JLCPCB Part Number: C541479; Supplier 1: LCSC; Category: Capacitors - MLCC; Supplier Part Number 1: C541479; Tolerance: ±5%; Voltage Rating: 50V; Temperature Coefficient: NP0; RoHS: Yes; ComponentLink1Description: Datasheet; ComponentLink1URL: https://wmsc.lcsc.com/wmsc/upload/file/pdf/v2/lcsc/2006151139_YAGEO-CC1206JRNPO9BN152_C541479.pdf; ComponentLink2Description: JLCPCB Part URL; ComponentLink2URL: https://jlcpcb.com/partdetail/C541479; ComponentLink3Description: LCSC Part URL; ComponentLink3URL: https://lcsc.com/product-detail/Multilayer-Ceramic-Capacitors-MLCC---SMD-SMT_YAGEO-YAGEO-CC1206JRNPO9BN152_C541479.html
footprint CAP-1206 (1206 (3216M) Capacitor)
pins: 1, 2

## CC1206JRNPO9BN180
designator C?  Capacitance: 18pF  (hidden comment: *)
Capacitor, Ceramic (MLCC), 18pF, ±5%, 50V, NP0, ±5%, SMD 1206; Manufacturer: YAGEO; Manufacturer Part Number: CC1206JRNPO9BN180; Package Size: 1206; JLCPCB Basic Part: No; JLCPCB Part Number: C577160; Supplier 1: LCSC; Category: Capacitors - MLCC; Supplier Part Number 1: C577160; Tolerance: ±5%; Voltage Rating: 50V; Temperature Coefficient: NP0; RoHS: Yes; ComponentLink1Description: Datasheet; ComponentLink1URL: https://wmsc.lcsc.com/wmsc/upload/file/pdf/v2/lcsc/2209231730_YAGEO-CC1206JRNPO9BN180_C577160.pdf; ComponentLink2Description: JLCPCB Part URL; ComponentLink2URL: https://jlcpcb.com/partdetail/C577160; ComponentLink3Description: LCSC Part URL; ComponentLink3URL: https://lcsc.com/product-detail/Multilayer-Ceramic-Capacitors-MLCC---SMD-SMT_YAGEO-YAGEO-CC1206JRNPO9BN180_C577160.html
footprint CAP-1206 (1206 (3216M) Capacitor)
pins: 1, 2

## CC1206JRNPO9BN182
designator C?  Capacitance: 1.8nF  (hidden comment: *)
Capacitor, Ceramic (MLCC), 1.8nF, ±5%, 50V, NP0, ±5%, SMD 1206; Manufacturer: YAGEO; Manufacturer Part Number: CC1206JRNPO9BN182; Package Size: 1206; JLCPCB Basic Part: No; JLCPCB Part Number: C527294; Supplier 1: LCSC; Category: Capacitors - MLCC; Supplier Part Number 1: C527294; Tolerance: ±5%; Voltage Rating: 50V; Temperature Coefficient: NP0; RoHS: Yes; ComponentLink1Description: Datasheet; ComponentLink1URL: https://wmsc.lcsc.com/wmsc/upload/file/pdf/v2/lcsc/2005222142_YAGEO-CC1206JRNPO9BN182_C527294.pdf; ComponentLink2Description: JLCPCB Part URL; ComponentLink2URL: https://jlcpcb.com/partdetail/C527294; ComponentLink3Description: LCSC Part URL; ComponentLink3URL: https://lcsc.com/product-detail/Multilayer-Ceramic-Capacitors-MLCC---SMD-SMT_YAGEO-YAGEO-CC1206JRNPO9BN182_C527294.html
footprint CAP-1206 (1206 (3216M) Capacitor)
pins: 1, 2

## CC1206JRNPO9BN200
designator C?  Capacitance: 20pF  (hidden comment: *)
Capacitor, Ceramic (MLCC), 20pF, ±5%, 50V, NP0, ±5%, SMD 1206; Manufacturer: YAGEO; Manufacturer Part Number: CC1206JRNPO9BN200; Package Size: 1206; JLCPCB Basic Part: No; JLCPCB Part Number: C113883; Supplier 1: LCSC; Category: Capacitors - MLCC; Supplier Part Number 1: C113883; Tolerance: ±5%; Voltage Rating: 50V; Temperature Coefficient: NP0; RoHS: Yes; ComponentLink1Description: Datasheet; ComponentLink1URL: https://wmsc.lcsc.com/wmsc/upload/file/pdf/v2/lcsc/2304140030_YAGEO-CC1206JRNPO9BN200_C113883.pdf; ComponentLink2Description: JLCPCB Part URL; ComponentLink2URL: https://jlcpcb.com/partdetail/C113883; ComponentLink3Description: LCSC Part URL; ComponentLink3URL: https://lcsc.com/product-detail/Multilayer-Ceramic-Capacitors-MLCC---SMD-SMT_YAGEO-YAGEO-CC1206JRNPO9BN200_C113883.html
footprint CAP-1206 (1206 (3216M) Capacitor)
pins: 1, 2

## CC1206JRNPO9BN220
designator C?  Capacitance: 22pF  (hidden comment: *)
Capacitor, Ceramic (MLCC), 22pF, ±5%, 50V, NP0, ±5%, SMD 1206; Manufacturer: YAGEO; Manufacturer Part Number: CC1206JRNPO9BN220; Package Size: 1206; JLCPCB Basic Part: No; JLCPCB Part Number: C327061; Supplier 1: LCSC; Category: Capacitors - MLCC; Supplier Part Number 1: C327061; Tolerance: ±5%; Voltage Rating: 50V; Temperature Coefficient: NP0; RoHS: Yes; ComponentLink1Description: Datasheet; ComponentLink1URL: https://wmsc.lcsc.com/wmsc/upload/file/pdf/v2/lcsc/1811141240_YAGEO-CC1206JRNPO9BN220_C327061.pdf; ComponentLink2Description: JLCPCB Part URL; ComponentLink2URL: https://jlcpcb.com/partdetail/C327061; ComponentLink3Description: LCSC Part URL; ComponentLink3URL: https://lcsc.com/product-detail/Multilayer-Ceramic-Capacitors-MLCC---SMD-SMT_YAGEO-YAGEO-CC1206JRNPO9BN220_C327061.html
footprint CAP-1206 (1206 (3216M) Capacitor)
pins: 1, 2

## CC1206JRNPO9BN221
designator C?  Capacitance: 220pF  (hidden comment: *)
Capacitor, Ceramic (MLCC), 220pF, ±5%, 50V, NP0, ±5%, SMD 1206; Manufacturer: YAGEO; Manufacturer Part Number: CC1206JRNPO9BN221; Package Size: 1206; JLCPCB Basic Part: No; JLCPCB Part Number: C113884; Supplier 1: LCSC; Category: Capacitors - MLCC; Supplier Part Number 1: C113884; Tolerance: ±5%; Voltage Rating: 50V; Temperature Coefficient: NP0; RoHS: Yes; ComponentLink1Description: Datasheet; ComponentLink1URL: https://wmsc.lcsc.com/wmsc/upload/file/pdf/v2/lcsc/2304140030_YAGEO-CC1206JRNPO9BN221_C113884.pdf; ComponentLink2Description: JLCPCB Part URL; ComponentLink2URL: https://jlcpcb.com/partdetail/C113884; ComponentLink3Description: LCSC Part URL; ComponentLink3URL: https://lcsc.com/product-detail/Multilayer-Ceramic-Capacitors-MLCC---SMD-SMT_YAGEO-YAGEO-CC1206JRNPO9BN221_C113884.html
footprint CAP-1206 (1206 (3216M) Capacitor)
pins: 1, 2

## CC1206JRNPO9BN222
designator C?  Capacitance: 2.2nF  (hidden comment: *)
Capacitor, Ceramic (MLCC), 2.2nF, ±5%, 50V, NP0, ±5%, SMD 1206; Manufacturer: YAGEO; Manufacturer Part Number: CC1206JRNPO9BN222; Package Size: 1206; JLCPCB Basic Part: No; JLCPCB Part Number: C326631; Supplier 1: LCSC; Category: Capacitors - MLCC; Supplier Part Number 1: C326631; Tolerance: ±5%; Voltage Rating: 50V; Temperature Coefficient: NP0; RoHS: Yes; ComponentLink1Description: Datasheet; ComponentLink1URL: https://wmsc.lcsc.com/wmsc/upload/file/pdf/v2/lcsc/1811061214_YAGEO-CC1206JRNPO9BN222_C326631.pdf; ComponentLink2Description: JLCPCB Part URL; ComponentLink2URL: https://jlcpcb.com/partdetail/C326631; ComponentLink3Description: LCSC Part URL; ComponentLink3URL: https://lcsc.com/product-detail/Multilayer-Ceramic-Capacitors-MLCC---SMD-SMT_YAGEO-YAGEO-CC1206JRNPO9BN222_C326631.html
footprint CAP-1206 (1206 (3216M) Capacitor)
pins: 1, 2

## CC1206JRNPO9BN270
designator C?  Capacitance: 27pF  (hidden comment: *)
Capacitor, Ceramic (MLCC), 27pF, ±5%, 50V, NP0, ±5%, SMD 1206; Manufacturer: YAGEO; Manufacturer Part Number: CC1206JRNPO9BN270; Package Size: 1206; JLCPCB Basic Part: No; JLCPCB Part Number: C577162; Supplier 1: LCSC; Category: Capacitors - MLCC; Supplier Part Number 1: C577162; Tolerance: ±5%; Voltage Rating: 50V; Temperature Coefficient: NP0; RoHS: Yes; ComponentLink1Description: Datasheet; ComponentLink1URL: https://wmsc.lcsc.com/wmsc/upload/file/pdf/v2/lcsc/2311211121_YAGEO-CC1206JRNPO9BN270_C577162.pdf; ComponentLink2Description: JLCPCB Part URL; ComponentLink2URL: https://jlcpcb.com/partdetail/C577162; ComponentLink3Description: LCSC Part URL; ComponentLink3URL: https://lcsc.com/product-detail/Multilayer-Ceramic-Capacitors-MLCC---SMD-SMT_YAGEO-YAGEO-CC1206JRNPO9BN270_C577162.html
footprint CAP-1206 (1206 (3216M) Capacitor)
pins: 1, 2

## CC1206JRNPO9BN272
designator C?  Capacitance: 2.7nF  (hidden comment: *)
Capacitor, Ceramic (MLCC), 2.7nF, ±5%, 50V, NP0, ±5%, SMD 1206; Manufacturer: YAGEO; Manufacturer Part Number: CC1206JRNPO9BN272; Package Size: 1206; JLCPCB Basic Part: No; JLCPCB Part Number: C527295; Supplier 1: LCSC; Category: Capacitors - MLCC; Supplier Part Number 1: C527295; Tolerance: ±5%; Voltage Rating: 50V; Temperature Coefficient: NP0; RoHS: Yes; ComponentLink1Description: Datasheet; ComponentLink1URL: https://wmsc.lcsc.com/wmsc/upload/file/pdf/v2/lcsc/2005261833_YAGEO-CC1206JRNPO9BN272_C527295.pdf; ComponentLink2Description: JLCPCB Part URL; ComponentLink2URL: https://jlcpcb.com/partdetail/C527295; ComponentLink3Description: LCSC Part URL; ComponentLink3URL: https://lcsc.com/product-detail/Multilayer-Ceramic-Capacitors-MLCC---SMD-SMT_YAGEO-YAGEO-CC1206JRNPO9BN272_C527295.html
footprint CAP-1206 (1206 (3216M) Capacitor)
pins: 1, 2

## CC1206JRNPO9BN300
designator C?  Capacitance: 30pF  (hidden comment: *)
Capacitor, Ceramic (MLCC), 30pF, ±5%, 50V, NP0, ±5%, SMD 1206; Manufacturer: YAGEO; Manufacturer Part Number: CC1206JRNPO9BN300; Package Size: 1206; JLCPCB Basic Part: No; JLCPCB Part Number: C577163; Supplier 1: LCSC; Category: Capacitors - MLCC; Supplier Part Number 1: C577163; Tolerance: ±5%; Voltage Rating: 50V; Temperature Coefficient: NP0; RoHS: Yes; ComponentLink1Description: Datasheet; ComponentLink1URL: https://wmsc.lcsc.com/wmsc/upload/file/pdf/v2/lcsc/2209151800_YAGEO-CC1206JRNPO9BN300_C577163.pdf; ComponentLink2Description: JLCPCB Part URL; ComponentLink2URL: https://jlcpcb.com/partdetail/C577163; ComponentLink3Description: LCSC Part URL; ComponentLink3URL: https://lcsc.com/product-detail/Multilayer-Ceramic-Capacitors-MLCC---SMD-SMT_YAGEO-YAGEO-CC1206JRNPO9BN300_C577163.html
footprint CAP-1206 (1206 (3216M) Capacitor)
pins: 1, 2

## CC1206JRNPO9BN330
designator C?  Capacitance: 33pF  (hidden comment: *)
Capacitor, Ceramic (MLCC), 33pF, ±5%, 50V, NP0, ±5%, SMD 1206; Manufacturer: YAGEO; Manufacturer Part Number: CC1206JRNPO9BN330; Package Size: 1206; JLCPCB Basic Part: No; JLCPCB Part Number: C327060; Supplier 1: LCSC; Category: Capacitors - MLCC; Supplier Part Number 1: C327060; Tolerance: ±5%; Voltage Rating: 50V; Temperature Coefficient: NP0; RoHS: Yes; ComponentLink1Description: Datasheet; ComponentLink1URL: https://wmsc.lcsc.com/wmsc/upload/file/pdf/v2/lcsc/1811141233_YAGEO-CC1206JRNPO9BN330_C327060.pdf; ComponentLink2Description: JLCPCB Part URL; ComponentLink2URL: https://jlcpcb.com/partdetail/C327060; ComponentLink3Description: LCSC Part URL; ComponentLink3URL: https://lcsc.com/product-detail/Multilayer-Ceramic-Capacitors-MLCC---SMD-SMT_YAGEO-YAGEO-CC1206JRNPO9BN330_C327060.html
footprint CAP-1206 (1206 (3216M) Capacitor)
pins: 1, 2

## CC1206JRNPO9BN331
designator C?  Capacitance: 330pF  (hidden comment: *)
Capacitor, Ceramic (MLCC), 330pF, ±5%, 50V, NP0, ±5%, SMD 1206; Manufacturer: YAGEO; Manufacturer Part Number: CC1206JRNPO9BN331; Package Size: 1206; JLCPCB Basic Part: No; JLCPCB Part Number: C541477; Supplier 1: LCSC; Category: Capacitors - MLCC; Supplier Part Number 1: C541477; Tolerance: ±5%; Voltage Rating: 50V; Temperature Coefficient: NP0; RoHS: Yes; ComponentLink1Description: Datasheet; ComponentLink1URL: https://wmsc.lcsc.com/wmsc/upload/file/pdf/v2/lcsc/2006151139_YAGEO-CC1206JRNPO9BN331_C541477.pdf; ComponentLink2Description: JLCPCB Part URL; ComponentLink2URL: https://jlcpcb.com/partdetail/C541477; ComponentLink3Description: LCSC Part URL; ComponentLink3URL: https://lcsc.com/product-detail/Multilayer-Ceramic-Capacitors-MLCC---SMD-SMT_YAGEO-YAGEO-CC1206JRNPO9BN331_C541477.html
footprint CAP-1206 (1206 (3216M) Capacitor)
pins: 1, 2

## CC1206JRNPO9BN332
designator C?  Capacitance: 3.3nF  (hidden comment: *)
Capacitor, Ceramic (MLCC), 3.3nF, ±5%, 50V, NP0, ±5%, SMD 1206; Manufacturer: YAGEO; Manufacturer Part Number: CC1206JRNPO9BN332; Package Size: 1206; JLCPCB Basic Part: No; JLCPCB Part Number: C326623; Supplier 1: LCSC; Category: Capacitors - MLCC; Supplier Part Number 1: C326623; Tolerance: ±5%; Voltage Rating: 50V; Temperature Coefficient: NP0; RoHS: Yes; ComponentLink1Description: Datasheet; ComponentLink1URL: https://wmsc.lcsc.com/wmsc/upload/file/pdf/v2/lcsc/1811061214_YAGEO-CC1206JRNPO9BN332_C326623.pdf; ComponentLink2Description: JLCPCB Part URL; ComponentLink2URL: https://jlcpcb.com/partdetail/C326623; ComponentLink3Description: LCSC Part URL; ComponentLink3URL: https://lcsc.com/product-detail/Multilayer-Ceramic-Capacitors-MLCC---SMD-SMT_YAGEO-YAGEO-CC1206JRNPO9BN332_C326623.html
footprint CAP-1206 (1206 (3216M) Capacitor)
pins: 1, 2